# Altium footprint library TarabusLibrary.PcbLib: 591 footprints (part 12 of 37)
Each footprint in its own frame and in the unit in brackets; x right, y up, seen from the top. Pads: shape width x height; smd on the part's side, far side on the other; paste and mask are expansions set on the pad; w line width, h text height; cw(c..) or ccw(c..) is an arc to the next point about the centre after c.
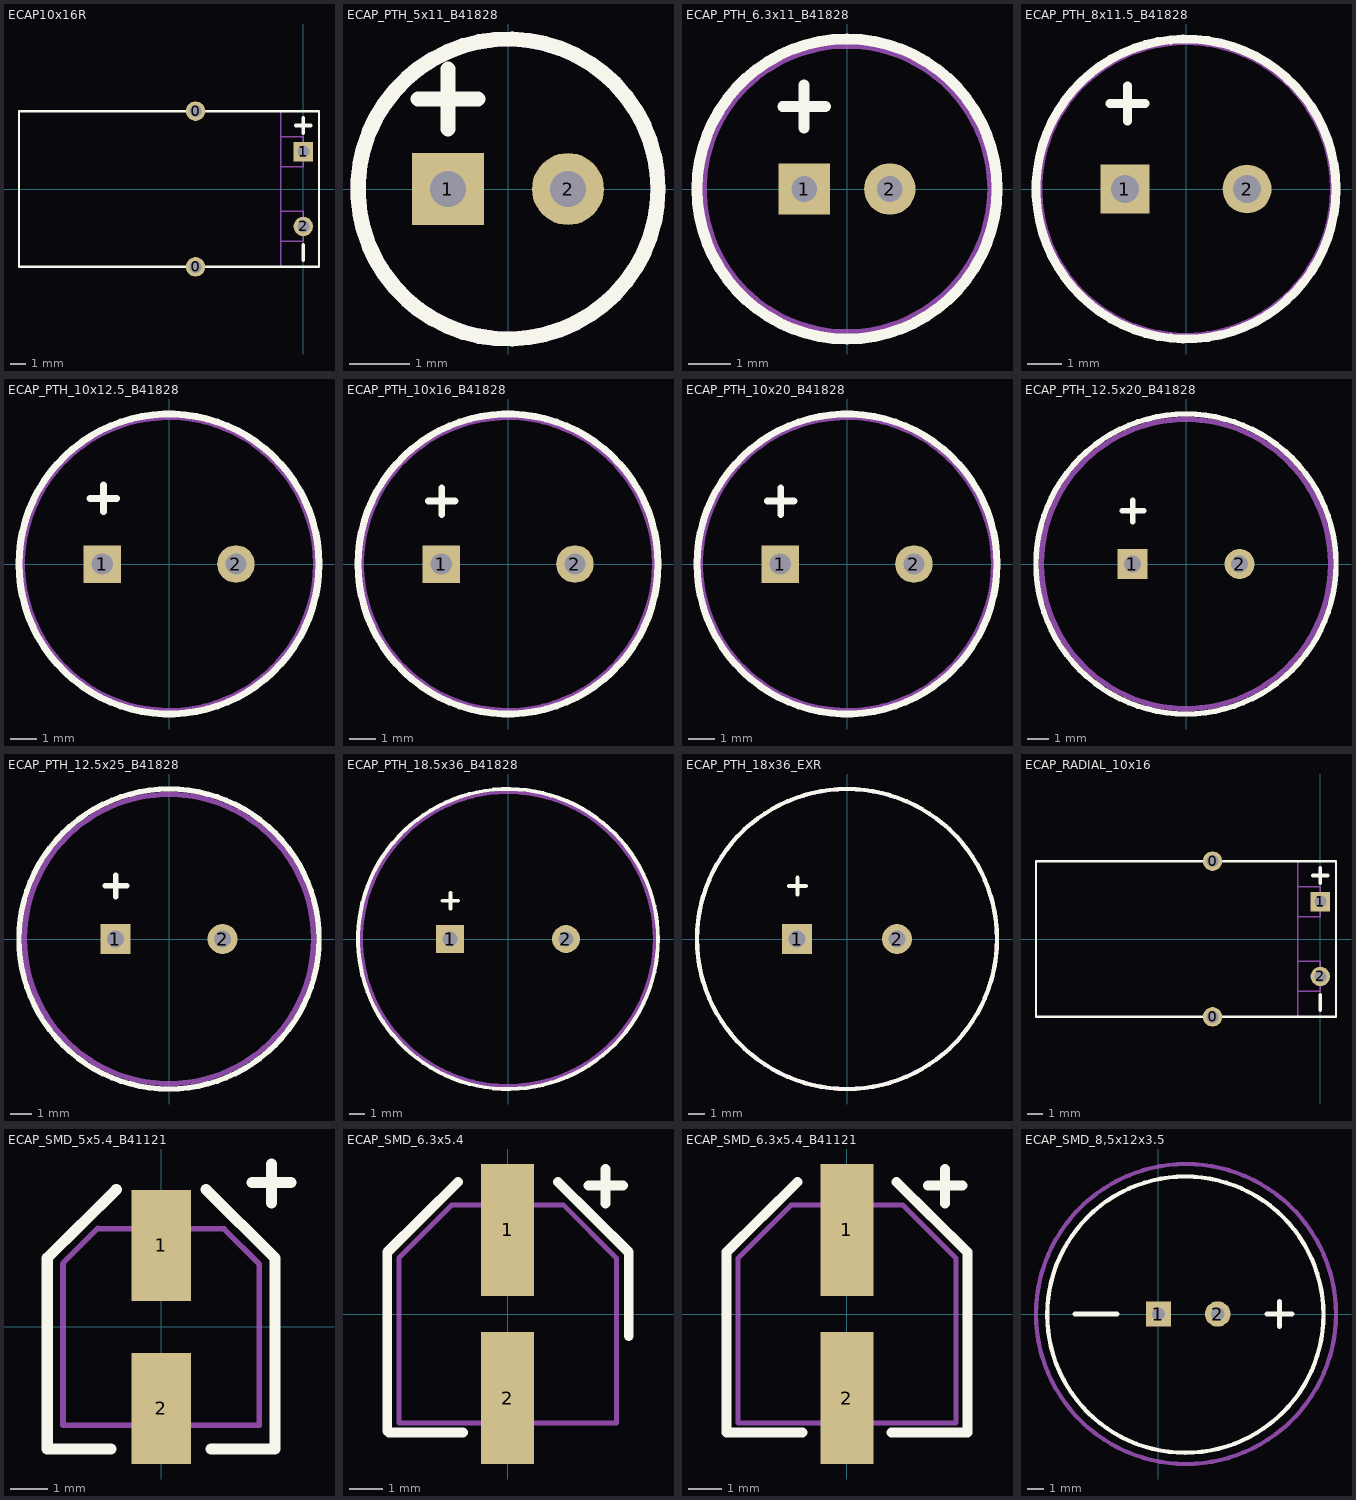
[diagram p11: the footprints below, top view; thin cyan lines are the x and y axes]

## ECAP10x16R [mm]
height 10
pads (4):
  round 1.3 hole 0.8: 0(-7.2,-5.2) 0(-7.2,5.2) 2(0,-2.5)
  rect 1.3x1.3 hole 0.8: 1(0,2.5)
Top Overlay:
  lines w0.15: -19,-5.2 -19,5.2 1.05,5.2 1.05,-5.2 -19,-5.2
  lines w0.254: -0.5,4.25 0.5,4.25 ; 0,-4.75 0,-3.75 ; 0,3.75 0,4.75
Mechanical 7:
  lines w0.1: -1.5,-3.5 0,-3.5 0,-1.5 -1.5,-1.5 ; -1.5,1.5 0,1.5 0,3.5 -1.5,3.5 ; -19,-5.2 -1.5,-5.2 -1.5,5.2 -19,5.2 -19,-5.2
Mechanical 10:
  text ".Designator" at -5.8,-0.2 h0.8
  text ".Comment" at -5.875,-1.2 h0.6
3D body: height 10.39, standoff 0.01, extent -19,-5.2 -1.5,5.159
3D body: height 5, standoff 0, extent -1.5,1.5 0,3.5
3D body: height 5, standoff 0, extent -1.5,-3.5 0,-1.5

## ECAP_PTH_5x11_B41828 [mm]
pads (2):
  rect 1.2x1.2 hole 0.6: 1(-1,0)
  round 1.2 hole 0.6: 2(1,0)
Top Overlay:
  circle w0.254: c0,0 r2.5
  lines w0.254: -1.5,1.5 -0.5,1.5 ; -1,1 -1,2
Mechanical 7:
  circle w0.254: c0,0 r2.5

## ECAP_PTH_6.3x11_B41828 [mm]
pads (2):
  rect 1.2x1.2 hole 0.6: 1(-1,0)
  round 1.2 hole 0.6: 2(1,0)
Top Overlay:
  circle w0.254: c0,0 r3.5
  lines w0.254: -1.5,1.925 -0.5,1.925 ; -1,1.425 -1,2.425
Mechanical 7:
  circle w0.254: c0,0 r3.4

## ECAP_PTH_8x11.5_B41828 [mm]
pads (2):
  rect 1.4x1.4 hole 0.8: 1(-1.75,0)
  round 1.4 hole 0.8: 2(1.75,0)
Top Overlay:
  circle w0.254: c0,0 r4.3
  lines w0.254: -2.175,2.45 -1.175,2.45 ; -1.675,1.95 -1.675,2.95
Mechanical 7:
  circle w0.254: c0,0 r4.25

## ECAP_PTH_10x12.5_B41828 [mm]
pads (2):
  rect 1.4x1.4 hole 0.8: 1(-2.5,0)
  round 1.4 hole 0.8: 2(2.5,0)
Top Overlay:
  circle w0.254: c0,0 r5.6
  lines w0.254: -2.95,2.45 -1.95,2.45 ; -2.45,1.95 -2.45,2.95
Mechanical 7:
  circle w0.254: c0,0 r5.5

## ECAP_PTH_10x16_B41828 [mm]
pads (2):
  rect 1.4x1.4 hole 0.8: 1(-2.5,0)
  round 1.4 hole 0.8: 2(2.5,0)
Top Overlay:
  circle w0.254: c0,0 r5.6
  lines w0.254: -2.975,2.35 -1.975,2.35 ; -2.475,1.85 -2.475,2.85
Mechanical 7:
  circle w0.254: c0,0 r5.5

## ECAP_PTH_10x20_B41828 [mm]
pads (2):
  rect 1.4x1.4 hole 0.8: 1(-2.5,0)
  round 1.4 hole 0.8: 2(2.5,0)
Top Overlay:
  circle w0.254: c0,0 r5.6
  lines w0.254: -2.975,2.35 -1.975,2.35 ; -2.475,1.85 -2.475,2.85
Mechanical 7:
  circle w0.254: c0,0 r5.5

## ECAP_PTH_12.5x20_B41828 [mm]
pads (2):
  rect 1.4x1.4 hole 0.8: 1(-2.5,0)
  round 1.4 hole 0.8: 2(2.5,0)
Top Overlay:
  circle w0.254: c0,0 r7
  lines w0.254: -2.975,2.475 -1.975,2.475 ; -2.475,1.975 -2.475,2.975
Mechanical 7:
  circle w0.254: c0,0 r6.75

## ECAP_PTH_12.5x25_B41828 [mm]
pads (2):
  rect 1.4x1.4 hole 0.8: 1(-2.5,0)
  round 1.4 hole 0.8: 2(2.5,0)
Top Overlay:
  circle w0.254: c0,0 r7
  lines w0.254: -2.975,2.475 -1.975,2.475 ; -2.475,1.975 -2.475,2.975
Mechanical 7:
  circle w0.254: c0,0 r6.75

## ECAP_PTH_18.5x36_B41828 [mm]
pads (2):
  rect 1.8x1.8 hole 1: 1(-3.75,0)
  round 1.8 hole 1: 2(3.75,0)
Top Overlay:
  circle w0.254: c0,0 r9.7
  lines w0.254: -4.225,2.475 -3.225,2.475 ; -3.725,1.975 -3.725,2.975
Mechanical 7:
  circle w0.254: c0,0 r9.5

## ECAP_PTH_18x36_EXR [mm]
pads (2):
  rect 1.8x1.8 hole 1: 1(-3,0)
  round 1.8 hole 1: 2(3,0)
Top Overlay:
  circle w0.254: c0,0 r9
  lines w0.254: -3.475,3.175 -2.475,3.175 ; -2.975,2.675 -2.975,3.675
Mechanical 7:
  circle w0.254: c0,0 r9

## ECAP_RADIAL_10x16 [mm]
height 10
pads (4):
  round 1.3 hole 0.8: 0(-7.2,-5.2) 0(-7.2,5.2) 2(0,-2.5)
  rect 1.3x1.3 hole 0.8: 1(0,2.5)
Top Overlay:
  lines w0.15: -19,-5.2 -19,5.2 1.05,5.2 1.05,-5.2 -19,-5.2
  lines w0.254: -0.5,4.25 0.5,4.25 ; 0,-4.75 0,-3.75 ; 0,3.75 0,4.75
Mechanical 7:
  lines w0.1: -1.5,-3.5 0,-3.5 0,-1.5 -1.5,-1.5 ; -1.5,1.5 0,1.5 0,3.5 -1.5,3.5 ; -19,-5.2 -1.5,-5.2 -1.5,5.2 -19,5.2 -19,-5.2
Mechanical 10:
  text ".Designator" at -5.8,-0.2 h0.8
  text ".Comment" at -5.875,-1.2 h0.6
3D body: height 10.39, standoff 0.01, extent -19,-5.2 -1.5,5.159
3D body: height 5, standoff 0, extent -1.5,1.5 0,3.5
3D body: height 5, standoff 0, extent -1.5,-3.5 0,-1.5

## ECAP_SMD_5x5.4_B41121 [mm] "6.5x5.4"
height 5.4
pads (2):
  rect 1.6x3 smd: 1(0,2.2) 2(0,-2.2)
Top Overlay:
  lines w0.3: -1.35,-3.3 -3.075,-3.3 -3.075,1.865 -1.211,3.707 ; 1.211,3.707 3.075,1.865 3.075,-3.3 1.35,-3.3 ; 2.45,3.9 3.5,3.9 ; 2.975,3.35 2.975,4.4
Mechanical 7:
  lines w0.15: -2.65,1.7 -2.65,-2.65 2.65,-2.65 2.65,1.7 1.7,2.65 -1.7,2.65 ; -2.625,1.75 -1.713,2.662

## ECAP_SMD_6.3x5.4 [mm] "6.5x5.4"
height 5.4
pads (2):
  rect 1.6x4 smd: 1(0,2.55) 2(0,-2.55)
Top Overlay:
  lines w0.3: -3.65,-3.55 -3.65,-3.05 -3.65,1.85 ; -3.65,1.875 -1.5,4 ; -3.6,-3.6 -1.35,-3.6 ; 1.525,4 3.675,1.875 ; 2.45,3.9 3.5,3.9 ; 2.975,3.35 2.975,4.4 ; 3.675,-0.675 3.675,1.85
Mechanical 7:
  lines w0.15: -3.3,-3.3 -3.3,1.7 -1.7,3.3 1.7,3.3 3.3,1.7 3.3,-3.3 -3.3,-3.3
3D body "User Library-ALU-D.STEP": height 5.4, standoff 0, extent -3.275,-3.5 3.325,3.5

## ECAP_SMD_6.3x5.4_B41121 [mm] "6.5x5.4"
height 5.4
pads (2):
  rect 1.6x4 smd: 1(0,2.55) 2(0,-2.55)
Top Overlay:
  lines w0.3: -3.65,-3.6 -3.65,1.85 ; -3.65,1.875 -1.5,4 ; -3.6,-3.6 -1.35,-3.6 ; 1.35,-3.6 3.6,-3.6 ; 1.5,4 3.65,1.875 ; 2.45,3.9 3.5,3.9 ; 2.975,3.35 2.975,4.4 ; 3.65,-3.6 3.65,1.85
Mechanical 7:
  lines w0.15: -3.3,-3.3 -3.3,1.7 -1.7,3.3 1.7,3.3 3.3,1.7 3.3,-3.3 -3.3,-3.3
3D body "User Library-ALU-D.STEP": height 5.4, standoff 0, extent -3.275,-3.5 3.325,3.5

## ECAP_SMD_8,5x12x3.5 [mil] "8,5x12x3.5"
height 472.44
pads (2):
  rect 60x60 hole 31.5: 1(0,0)
  round 60 hole 31.5: 2(140,0)
Top Overlay:
  circle w10: c63.43,-1.57 r326.27
  lines w11.81: -196.85,0 -98.43,0 ; 255.91,0 314.96,0 ; 285.43,-29.53 285.43,29.53
Mechanical 1:
  circle w10: c65,0 r354.33